# Altium footprint library 3M THD.PcbLib: 163 footprints (part 9 of 14)
Each footprint in its own frame and in the unit in brackets; x right, y up, seen from the top. Pads: shape width x height; smd on the part's side, far side on the other; paste and mask are expansions set on the pad; w line width, h text height; cw(c..) or ccw(c..) is an arc to the next point about the centre after c.
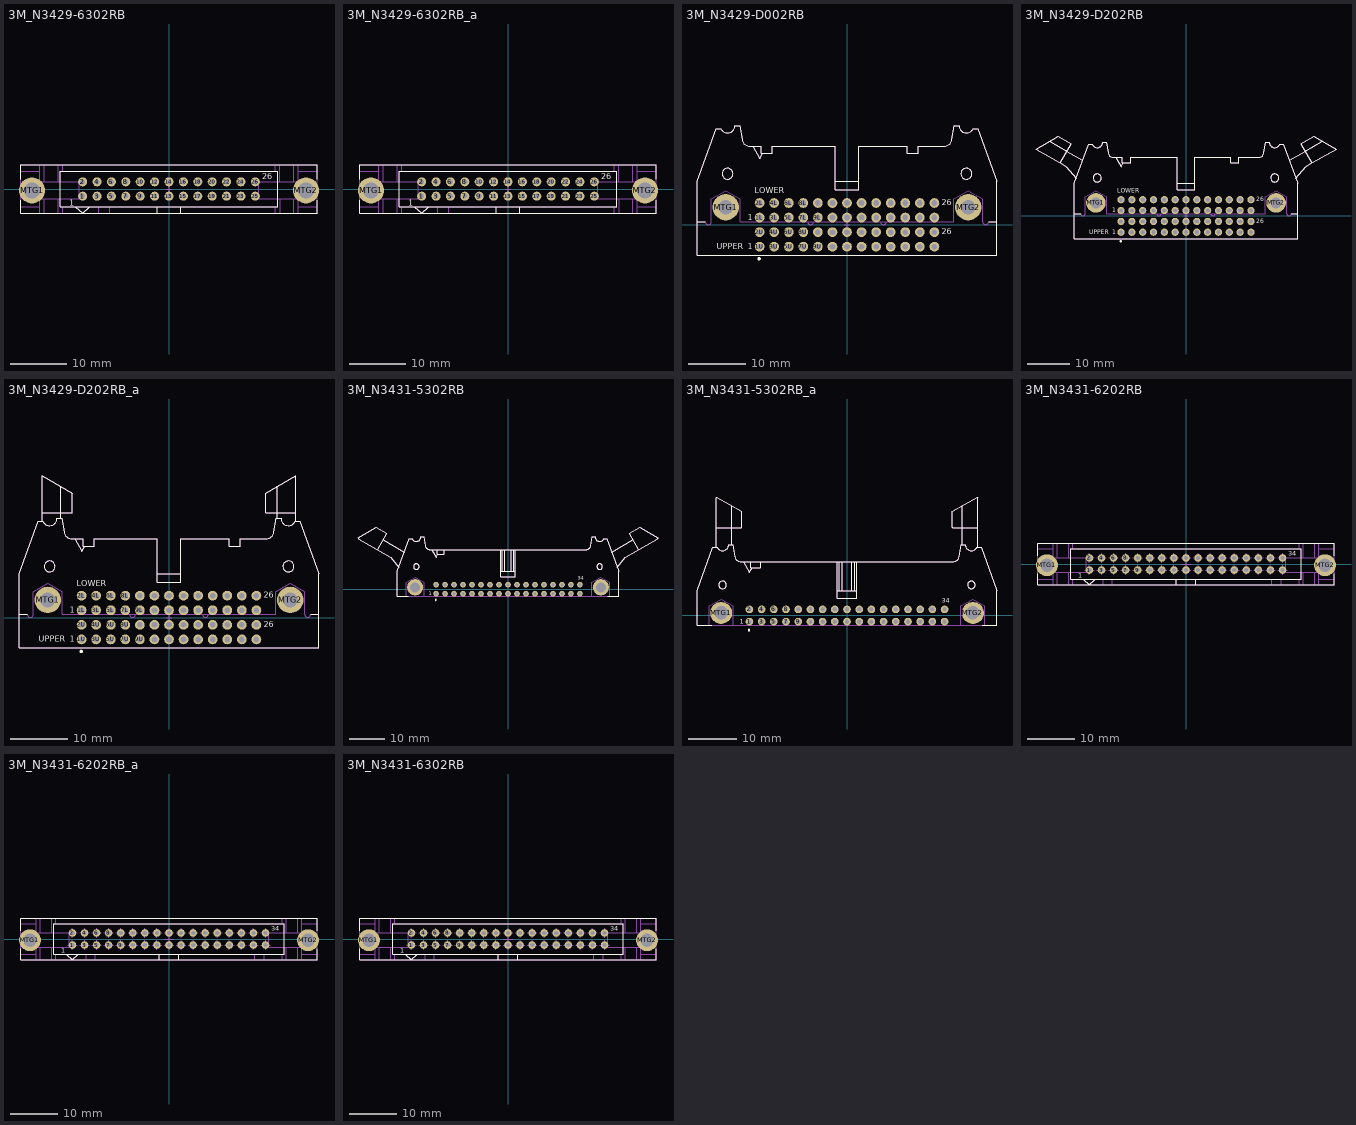
[diagram p8: the footprints below, top view; thin cyan lines are the x and y axes]

## 3M_N3429-6302RB [mm] "3M, 3000 Series, 26 Contacts - Pitch 2.54mm - Straight Four-Wall Header (Black) With Long Roll Pin Latch/Ejectors"
height 24.6
pads (28):
  round 1.6 hole 0.9: 1(-15.24,-1.27) 2(-15.24,1.27) 3(-12.7,-1.27) 4(-12.7,1.27) 5(-10.16,-1.27) 6(-10.16,1.27) 7(-7.62,-1.27) 8(-7.62,1.27) 9(-5.08,-1.27) 10(-5.08,1.27) 11(-2.54,-1.27) 12(-2.54,1.27) 13(0,-1.27) 14(0,1.27) 15(2.54,-1.27) 16(2.54,1.27) 17(5.08,-1.27) 18(5.08,1.27) 19(7.62,-1.27) 20(7.62,1.27) 21(10.16,-1.27) 22(10.16,1.27) 23(12.7,-1.27) 24(12.7,1.27) 25(15.24,-1.27) 26(15.24,1.27)
  round 4.6 hole 2.8: MTG1(-24.18,-0.25) MTG2(24.18,-0.25)
Top Overlay:
  lines w0.2: -26.162,-2 -26.162,-4.318 26.162,-4.318 26.162,-2 ; -26.162,1.7 -26.162,4.3 ; -26.162,4.318 26.162,4.318 ; -2.032,-4.318 -2.032,-3.175 ; 2.032,-4.318 2.032,-3.175 ; 26.162,1.7 26.162,4.3 ; -19.177,-3.175 19.177,-3.175 19.177,3.175 -19.177,3.175 -19.177,-3.175 ; -16.51,-3.175 -13.97,-3.175 -15.24,-4.318 -16.51,-3.175
  text "1" at -17.577,-2.921 h1.02
  text "26" at 16.475,1.727 h1.02
Mechanical 8:
  lines w0.1: -24.68,-0.25 -24.18,-0.25 ; -24.18,-0.75 -24.18,-0.25 ; -24.18,0.25 -24.18,-0.25 ; -23.68,-0.25 -24.18,-0.25 ; -15.74,-1.27 -15.24,-1.27 ; -15.74,1.27 -15.24,1.27 ; -15.24,-1.77 -15.24,-1.27 ; -15.24,-0.77 -15.24,-1.27 ; -15.24,0.77 -15.24,1.27 ; -15.24,1.77 -15.24,1.27 ; -14.74,-1.27 -15.24,-1.27 ; -14.74,1.27 -15.24,1.27 ; -13.2,-1.27 -12.7,-1.27 ; -13.2,1.27 -12.7,1.27 ; -12.7,-1.77 -12.7,-1.27 ; -12.7,-0.77 -12.7,-1.27 ; -12.7,0.77 -12.7,1.27 ; -12.7,1.77 -12.7,1.27 ; -12.2,-1.27 -12.7,-1.27 ; -12.2,1.27 -12.7,1.27 ; -10.66,-1.27 -10.16,-1.27 ; -10.66,1.27 -10.16,1.27 ; -10.16,-1.77 -10.16,-1.27 ; -10.16,-0.77 -10.16,-1.27 ; -10.16,0.77 -10.16,1.27 ; -10.16,1.77 -10.16,1.27 ; -9.66,-1.27 -10.16,-1.27 ; -9.66,1.27 -10.16,1.27 ; -8.12,-1.27 -7.62,-1.27 ; -8.12,1.27 -7.62,1.27 ; -7.62,-1.77 -7.62,-1.27 ; -7.62,-0.77 -7.62,-1.27 ; -7.62,0.77 -7.62,1.27 ; -7.62,1.77 -7.62,1.27 ; -7.12,-1.27 -7.62,-1.27 ; -7.12,1.27 -7.62,1.27 ; -5.58,-1.27 -5.08,-1.27 ; -5.58,1.27 -5.08,1.27 ; -5.08,-1.77 -5.08,-1.27 ; -5.08,-0.77 -5.08,-1.27 ; -5.08,0.77 -5.08,1.27 ; -5.08,1.77 -5.08,1.27 ; -4.58,-1.27 -5.08,-1.27 ; -4.58,1.27 -5.08,1.27 ; -3.04,-1.27 -2.54,-1.27 ; -3.04,1.27 -2.54,1.27 ; -2.54,-1.77 -2.54,-1.27 ; -2.54,-0.77 -2.54,-1.27 ; -2.54,0.77 -2.54,1.27 ; -2.54,1.77 -2.54,1.27 ; -2.04,-1.27 -2.54,-1.27 ; -2.04,1.27 -2.54,1.27 ; -0.5,-1.27 0,-1.27 ; -0.5,0 0,0 ; -0.5,1.27 0,1.27 ; 0,-1.77 0,-1.27 ; 0,-0.77 0,-1.27 ; 0,-0.5 0,0 ; 0,0.5 0,0 ; 0,0.77 0,1.27 ; 0,1.77 0,1.27 ; 0.5,-1.27 0,-1.27 ; 0.5,0 0,0 ; 0.5,1.27 0,1.27 ; 2.04,-1.27 2.54,-1.27 ; 2.04,1.27 2.54,1.27 ; 2.54,-1.77 2.54,-1.27 ; 2.54,-0.77 2.54,-1.27 ; 2.54,0.77 2.54,1.27 ; 2.54,1.77 2.54,1.27 ; 3.04,-1.27 2.54,-1.27 ; 3.04,1.27 2.54,1.27 ; 4.58,-1.27 5.08,-1.27 ; 4.58,1.27 5.08,1.27 ; 5.08,-1.77 5.08,-1.27 ; 5.08,-0.77 5.08,-1.27 ; 5.08,0.77 5.08,1.27 ; 5.08,1.77 5.08,1.27 ; 5.58,-1.27 5.08,-1.27 ; 5.58,1.27 5.08,1.27 ; 7.12,-1.27 7.62,-1.27 ; 7.12,1.27 7.62,1.27 ; 7.62,-1.77 7.62,-1.27 ; 7.62,-0.77 7.62,-1.27 ; 7.62,0.77 7.62,1.27 ; 7.62,1.77 7.62,1.27 ; 8.12,-1.27 7.62,-1.27 ; 8.12,1.27 7.62,1.27 ; 9.66,-1.27 10.16,-1.27 ; 9.66,1.27 10.16,1.27 ; 10.16,-1.77 10.16,-1.27 ; 10.16,-0.77 10.16,-1.27 ; 10.16,0.77 10.16,1.27 ; 10.16,1.77 10.16,1.27 ; 10.66,-1.27 10.16,-1.27 ; 10.66,1.27 10.16,1.27 ; 12.2,-1.27 12.7,-1.27 ; 12.2,1.27 12.7,1.27 ; 12.7,-1.77 12.7,-1.27 ; 12.7,-0.77 12.7,-1.27 ; 12.7,0.77 12.7,1.27 ; 12.7,1.77 12.7,1.27 ; 13.2,-1.27 12.7,-1.27 ; 13.2,1.27 12.7,1.27 ; 14.74,-1.27 15.24,-1.27 ; 14.74,1.27 15.24,1.27 ; 15.24,-1.77 15.24,-1.27 ; 15.24,-0.77 15.24,-1.27 ; 15.24,0.77 15.24,1.27 ; 15.24,1.77 15.24,1.27 ; 15.74,-1.27 15.24,-1.27 ; 15.74,1.27 15.24,1.27 ; 23.68,-0.25 24.18,-0.25 ; 24.18,-0.75 24.18,-0.25 ; 24.18,0.25 24.18,-0.25 ; 24.68,-0.25 24.18,-0.25
Mechanical 14:
  circle w0.1: c24.194,-0.254 r1.27
  circle w0.1: c-24.194,-0.254 r1.27
  lines w0.1: -26.162,-3.175 -22.834,-3.175 ; -22.834,-4.318 -22.834,-1.727 -15.875,-1.727 -15.875,1.27 -22.834,1.27 -22.834,4.318 ; -21.992,-4.318 -21.992,-1.727 ; -21.992,1.27 -21.992,4.318 ; -19.559,-4.318 -19.558,-1.727 ; -19.177,-1.727 -19.177,-3.175 19.177,-3.175 19.177,-1.727 ; -19.177,1.27 -19.177,3.175 19.177,3.175 19.177,1.27 ; -12.389,-4.318 -12.389,-3.175 ; -10.471,-4.318 -10.471,-3.175 ; 18.716,-4.318 18.716,-3.175 ; 18.716,3.175 18.716,4.318 ; 19.558,1.27 19.558,4.318 ; 19.599,-4.318 19.599,-1.727 ; 21.992,-4.318 21.992,-1.727 ; 21.992,1.27 21.992,4.318 ; 22.834,-4.318 22.834,-1.727 15.875,-1.727 15.875,1.27 22.834,1.27 22.834,4.318 ; 22.834,-3.175 26.162,-3.175 ; 22.834,3.175 26.162,3.175 ; -26.162,-4.318 -26.162,4.318 26.162,4.318 26.162,-4.318 -26.162,-4.318 ; -26.162,3.175 -22.834,3.175 -26.162,3.175 ; -25.718,-1.134 -24.194,-2.014 -22.67,-1.134 -22.67,0.626 -24.194,1.506 -25.718,0.626 -25.718,-1.134 ; -19.558,1.27 -19.558,4.318 -19.558,1.27 ; -18.716,-4.318 -18.716,-3.175 -18.716,-4.318 ; -18.716,3.175 -18.716,4.318 -18.716,3.175 ; -16.51,-3.175 -13.97,-3.175 -15.24,-4.318 -16.51,-3.175 ; 22.67,-1.134 24.194,-2.014 25.718,-1.134 25.718,0.626 24.194,1.506 22.67,0.626 22.67,-1.134
  text "1" at -17.577,-2.921 h1.02
  text "26" at 16.475,1.727 h1.02
3D body "3M_N3429-6302RB.stp": height 19.96, standoff -2.84, extent -37.289,-4.318 37.289,4.318

## 3M_N3429-6302RB_a [mm] "3M, 3000 Series, 26 Contacts - Pitch 2.54mm - Straight Four-Wall Header (Black) With Long Roll Pin Latch/Ejectors"
height 24.6
pads (28):
  round 1.6 hole 0.9: 1(-15.24,-1.27) 2(-15.24,1.27) 3(-12.7,-1.27) 4(-12.7,1.27) 5(-10.16,-1.27) 6(-10.16,1.27) 7(-7.62,-1.27) 8(-7.62,1.27) 9(-5.08,-1.27) 10(-5.08,1.27) 11(-2.54,-1.27) 12(-2.54,1.27) 13(0,-1.27) 14(0,1.27) 15(2.54,-1.27) 16(2.54,1.27) 17(5.08,-1.27) 18(5.08,1.27) 19(7.62,-1.27) 20(7.62,1.27) 21(10.16,-1.27) 22(10.16,1.27) 23(12.7,-1.27) 24(12.7,1.27) 25(15.24,-1.27) 26(15.24,1.27)
  round 4.6 hole 2.8: MTG1(-24.18,-0.25) MTG2(24.18,-0.25)
Top Overlay:
  lines w0.2: -26.162,-2 -26.162,-4.318 26.162,-4.318 26.162,-2 ; -26.162,1.7 -26.162,4.3 ; -26.162,4.318 26.162,4.318 ; -2.032,-4.318 -2.032,-3.175 ; 2.032,-4.318 2.032,-3.175 ; 26.162,1.7 26.162,4.3 ; -19.177,-3.175 -19.177,3.175 19.177,3.175 19.177,-3.175 -19.177,-3.175 ; -16.51,-3.175 -15.24,-4.318 -13.97,-3.175 -16.51,-3.175
  text "26" at 16.475,1.727 h1.02
  text "1" at -17.577,-2.921 h1.02
Mechanical 8:
  lines w0.1: -24.68,-0.25 -24.18,-0.25 ; -24.18,-0.75 -24.18,-0.25 ; -24.18,0.25 -24.18,-0.25 ; -23.68,-0.25 -24.18,-0.25 ; -15.74,-1.27 -15.24,-1.27 ; -15.74,1.27 -15.24,1.27 ; -15.24,-1.77 -15.24,-1.27 ; -15.24,-0.77 -15.24,-1.27 ; -15.24,0.77 -15.24,1.27 ; -15.24,1.77 -15.24,1.27 ; -14.74,-1.27 -15.24,-1.27 ; -14.74,1.27 -15.24,1.27 ; -13.2,-1.27 -12.7,-1.27 ; -13.2,1.27 -12.7,1.27 ; -12.7,-1.77 -12.7,-1.27 ; -12.7,-0.77 -12.7,-1.27 ; -12.7,0.77 -12.7,1.27 ; -12.7,1.77 -12.7,1.27 ; -12.2,-1.27 -12.7,-1.27 ; -12.2,1.27 -12.7,1.27 ; -10.66,-1.27 -10.16,-1.27 ; -10.66,1.27 -10.16,1.27 ; -10.16,-1.77 -10.16,-1.27 ; -10.16,-0.77 -10.16,-1.27 ; -10.16,0.77 -10.16,1.27 ; -10.16,1.77 -10.16,1.27 ; -9.66,-1.27 -10.16,-1.27 ; -9.66,1.27 -10.16,1.27 ; -8.12,-1.27 -7.62,-1.27 ; -8.12,1.27 -7.62,1.27 ; -7.62,-1.77 -7.62,-1.27 ; -7.62,-0.77 -7.62,-1.27 ; -7.62,0.77 -7.62,1.27 ; -7.62,1.77 -7.62,1.27 ; -7.12,-1.27 -7.62,-1.27 ; -7.12,1.27 -7.62,1.27 ; -5.58,-1.27 -5.08,-1.27 ; -5.58,1.27 -5.08,1.27 ; -5.08,-1.77 -5.08,-1.27 ; -5.08,-0.77 -5.08,-1.27 ; -5.08,0.77 -5.08,1.27 ; -5.08,1.77 -5.08,1.27 ; -4.58,-1.27 -5.08,-1.27 ; -4.58,1.27 -5.08,1.27 ; -3.04,-1.27 -2.54,-1.27 ; -3.04,1.27 -2.54,1.27 ; -2.54,-1.77 -2.54,-1.27 ; -2.54,-0.77 -2.54,-1.27 ; -2.54,0.77 -2.54,1.27 ; -2.54,1.77 -2.54,1.27 ; -2.04,-1.27 -2.54,-1.27 ; -2.04,1.27 -2.54,1.27 ; -0.5,-1.27 0,-1.27 ; -0.5,0 0,0 ; -0.5,1.27 0,1.27 ; 0,-1.77 0,-1.27 ; 0,-0.77 0,-1.27 ; 0,-0.5 0,0 ; 0,0.5 0,0 ; 0,0.77 0,1.27 ; 0,1.77 0,1.27 ; 0.5,-1.27 0,-1.27 ; 0.5,0 0,0 ; 0.5,1.27 0,1.27 ; 2.04,-1.27 2.54,-1.27 ; 2.04,1.27 2.54,1.27 ; 2.54,-1.77 2.54,-1.27 ; 2.54,-0.77 2.54,-1.27 ; 2.54,0.77 2.54,1.27 ; 2.54,1.77 2.54,1.27 ; 3.04,-1.27 2.54,-1.27 ; 3.04,1.27 2.54,1.27 ; 4.58,-1.27 5.08,-1.27 ; 4.58,1.27 5.08,1.27 ; 5.08,-1.77 5.08,-1.27 ; 5.08,-0.77 5.08,-1.27 ; 5.08,0.77 5.08,1.27 ; 5.08,1.77 5.08,1.27 ; 5.58,-1.27 5.08,-1.27 ; 5.58,1.27 5.08,1.27 ; 7.12,-1.27 7.62,-1.27 ; 7.12,1.27 7.62,1.27 ; 7.62,-1.77 7.62,-1.27 ; 7.62,-0.77 7.62,-1.27 ; 7.62,0.77 7.62,1.27 ; 7.62,1.77 7.62,1.27 ; 8.12,-1.27 7.62,-1.27 ; 8.12,1.27 7.62,1.27 ; 9.66,-1.27 10.16,-1.27 ; 9.66,1.27 10.16,1.27 ; 10.16,-1.77 10.16,-1.27 ; 10.16,-0.77 10.16,-1.27 ; 10.16,0.77 10.16,1.27 ; 10.16,1.77 10.16,1.27 ; 10.66,-1.27 10.16,-1.27 ; 10.66,1.27 10.16,1.27 ; 12.2,-1.27 12.7,-1.27 ; 12.2,1.27 12.7,1.27 ; 12.7,-1.77 12.7,-1.27 ; 12.7,-0.77 12.7,-1.27 ; 12.7,0.77 12.7,1.27 ; 12.7,1.77 12.7,1.27 ; 13.2,-1.27 12.7,-1.27 ; 13.2,1.27 12.7,1.27 ; 14.74,-1.27 15.24,-1.27 ; 14.74,1.27 15.24,1.27 ; 15.24,-1.77 15.24,-1.27 ; 15.24,-0.77 15.24,-1.27 ; 15.24,0.77 15.24,1.27 ; 15.24,1.77 15.24,1.27 ; 15.74,-1.27 15.24,-1.27 ; 15.74,1.27 15.24,1.27 ; 23.68,-0.25 24.18,-0.25 ; 24.18,-0.75 24.18,-0.25 ; 24.18,0.25 24.18,-0.25 ; 24.68,-0.25 24.18,-0.25
Mechanical 14:
  circle w0.1: c-24.194,-0.254 r1.27
  circle w0.1: c24.194,-0.254 r1.27
  lines w0.1: -26.162,-3.175 -22.834,-3.175 ; -22.834,-4.318 -22.834,-1.727 -15.875,-1.727 -15.875,1.27 -22.834,1.27 -22.834,4.318 ; -21.992,-4.318 -21.992,-1.727 ; -21.992,1.27 -21.992,4.318 ; -19.559,-4.318 -19.558,-1.727 ; -19.177,-1.727 -19.177,-3.175 19.177,-3.175 19.177,-1.727 ; -19.177,1.27 -19.177,3.175 19.177,3.175 19.177,1.27 ; -12.389,-4.318 -12.389,-3.175 ; -10.471,-4.318 -10.471,-3.175 ; 18.716,-4.318 18.716,-3.175 ; 18.716,3.175 18.716,4.318 ; 19.558,1.27 19.558,4.318 ; 19.599,-4.318 19.599,-1.727 ; 21.992,-4.318 21.992,-1.727 ; 21.992,1.27 21.992,4.318 ; 22.834,-4.318 22.834,-1.727 15.875,-1.727 15.875,1.27 22.834,1.27 22.834,4.318 ; 22.834,-3.175 26.162,-3.175 ; 22.834,3.175 26.162,3.175 ; -26.162,-4.318 26.162,-4.318 26.162,4.318 -26.162,4.318 -26.162,-4.318 ; -26.162,3.175 -22.834,3.175 -26.162,3.175 ; -25.718,-1.134 -25.718,0.626 -24.194,1.506 -22.67,0.626 -22.67,-1.134 -24.194,-2.014 -25.718,-1.134 ; -19.558,1.27 -19.558,4.318 -19.558,1.27 ; -18.716,-4.318 -18.716,-3.175 -18.716,-4.318 ; -18.716,3.175 -18.716,4.318 -18.716,3.175 ; -16.51,-3.175 -15.24,-4.318 -13.97,-3.175 -16.51,-3.175 ; 22.67,-1.134 22.67,0.626 24.194,1.506 25.718,0.626 25.718,-1.134 24.194,-2.014 22.67,-1.134
  text "26" at 16.475,1.727 h1.02
  text "1" at -17.577,-2.921 h1.02
3D body "3M_N3429-6302RB_a.stp": height 27.18, standoff -2.84, extent -26.162,-4.318 26.162,4.318

## 3M_N3429-D002RB [mm] "3M, 3000 Series, 2x26 Contacts - Pitch 2.54mm - Right Angle Four-Wall Condo Header (Black) Without Latch/Ejectors"
height 15.5
pads (54):
  round 1.7 hole 1: 1L(-15.24,1.27) 1U(-15.24,-3.81) 2L(-15.24,3.81) 2U(-15.24,-1.27) 3L(-12.7,1.27) 3U(-12.7,-3.81) 4L(-12.7,3.81) 4U(-12.7,-1.27) 5L(-10.16,1.27) 5U(-10.16,-3.81) 6L(-10.16,3.81) 6U(-10.16,-1.27) 7L(-7.62,1.27) 7U(-7.62,-3.81) 8L(-7.62,3.81) 8U(-7.62,-1.27) 9L(-5.08,1.27) 9U(-5.08,-3.81) 10L(-5.08,3.81) 10U(-5.08,-1.27) 11L(-2.54,1.27) 11U(-2.54,-3.81) 12L(-2.54,3.81) 12U(-2.54,-1.27) 13L(0,1.27) 13U(0,-3.81) 14L(0,3.81) 14U(0,-1.27) 15L(2.54,1.27) 15U(2.54,-3.81) 16L(2.54,3.81) 16U(2.54,-1.27) 17L(5.08,1.27) 17U(5.08,-3.81) 18L(5.08,3.81) 18U(5.08,-1.27) 19L(7.62,1.27) 19U(7.62,-3.81) 20L(7.62,3.81) 20U(7.62,-1.27) 21L(10.16,1.27) 21U(10.16,-3.81) 22L(10.16,3.81) 22U(10.16,-1.27) 23L(12.7,1.27) 23U(12.7,-3.81) 24L(12.7,3.81) 24U(12.7,-1.27) 25L(15.24,1.27) 25U(15.24,-3.81) 26L(15.24,3.81) 26U(15.24,-1.27)
  round 4.6 hole 2.6: MTG1(-21.146,3.073) MTG2(21.146,3.073)
Top Overlay:
  circle w0.2: c-20.828,8.915 r0.953
  circle w0.2: c20.828,8.915 r0.953
  circle w0.2: c20.828,8.915 r0.953
  circle w0.2: c-20.828,8.915 r0.953
  circle w0.2: c-20.828,8.915 r0.953
  circle w0.3: c-15.313,-5.913 r0.15
  lines w0.2: -26.162,0.533 -24.702,0.533 ; -16.478,13.741 -15.208,11.542 -14.671,12.471 ; -2.032,7.645 2.032,7.645 ; 24.702,0.533 26.162,0.533 ; -26.162,-5.309 -26.162,7.645 -22.834,16.789 -21.992,16.789 ccw(c-20.828,17.297) -19.558,17.297 -18.716,17.297 -18.286,14.859 ccw(c-16.989,15.053) -16.954,13.741 -14.929,13.741 -14.929,12.471 -13.011,12.471 -13.011,13.741 -2.032,13.741 -2.032,6.121 2.032,6.121 2.032,13.741 10.471,13.741 10.471,12.471 12.389,12.471 12.389,13.741 16.954,13.741 ccw(c16.989,15.053) 18.286,14.859 18.716,17.297 19.558,17.297 ccw(c20.828,17.297) 21.992,16.789 22.834,16.789 26.162,7.645 26.162,-5.309 -26.162,-5.309
  text "26" at 16.5,3.429 h1.02
  text "1" at -17.272,0.84 h1.02
  text "1" at -17.272,-4.24 h1.02
  text "UPPER" at -22.75,-4.25 h1
  text "LOWER" at -16.125,5.475 h1
  text "26" at 16.5,-1.651 h1.02
Mechanical 8:
  drawing of 245 lines, arcs and shapes, not listed
Mechanical 14:
  circle w0.1: c-21.146,3.073 r1.27
  circle w0.1: c21.146,3.073 r1.27
  circle w0.1: c-20.828,8.915 r0.953
  circle w0.1: c20.828,8.915 r0.953
  lines w0.1: -26.162,0.533 -24.702,0.533 ccw(c-24.194,0.533) -23.686,0.533 -23.647,0.533 -23.647,4.518 -21.146,5.962 -18.644,4.518 -18.644,0.533 18.644,0.533 18.644,4.518 21.146,5.962 23.647,4.518 23.647,0.533 23.686,0.533 ccw(c24.194,0.533) 24.702,0.533 26.162,0.533 ; -16.478,13.741 -15.208,11.542 -14.671,12.471 ; -6.858,0.533 ccw(c-6.35,0.533) -5.842,0.533 ; -2.032,7.645 2.032,7.645 ; 5.842,0.533 ccw(c6.35,0.533) 6.858,0.533 ; -26.162,-5.309 -26.162,7.645 -22.834,16.789 -21.992,16.789 ccw(c-20.828,17.297) -19.558,17.297 -18.716,17.297 -18.286,14.859 ccw(c-16.989,15.053) -16.954,13.741 -14.929,13.741 -14.929,12.471 -13.011,12.471 -13.011,13.741 -2.032,13.741 -2.032,6.121 2.032,6.121 2.032,13.741 10.471,13.741 10.471,12.471 12.389,12.471 12.389,13.741 16.954,13.741 ccw(c16.989,15.053) 18.286,14.859 18.716,17.297 19.558,17.297 ccw(c20.828,17.297) 21.992,16.789 22.834,16.789 26.162,7.645 26.162,-5.309 -26.162,-5.309
  text "26" at 16.5,3.429 h1.02
  text "1" at -17.272,0.84 h1.02
  text "1" at -17.272,-4.24 h1.02
  text "1" at -17.272,-4.24 h1.02
  text "UPPER" at -22.75,-4.25 h1
  text "LOWER" at -16.125,5.475 h1
  text "26" at 16.5,-1.651 h1.02
3D body "3M_N3429-D002RB.stp": height 15.49, standoff -2.84, extent -26.162,-5.308 26.162,17.298

## 3M_N3429-D202RB [mm] "3M, 3000 Series, 2x26 Contacts - Pitch 2.54mm - Right Angle Four-Wall Condo Header (Black) With Short Roll Pin Latch/Ejectors"
height 15.5
pads (54):
  round 1.7 hole 1: 1L(-15.24,1.27) 1U(-15.24,-3.81) 2L(-15.24,3.81) 2U(-15.24,-1.27) 3L(-12.7,1.27) 3U(-12.7,-3.81) 4L(-12.7,3.81) 4U(-12.7,-1.27) 5L(-10.16,1.27) 5U(-10.16,-3.81) 6L(-10.16,3.81) 6U(-10.16,-1.27) 7L(-7.62,1.27) 7U(-7.62,-3.81) 8L(-7.62,3.81) 8U(-7.62,-1.27) 9L(-5.08,1.27) 9U(-5.08,-3.81) 10L(-5.08,3.81) 10U(-5.08,-1.27) 11L(-2.54,1.27) 11U(-2.54,-3.81) 12L(-2.54,3.81) 12U(-2.54,-1.27) 13L(0,1.27) 13U(0,-3.81) 14L(0,3.81) 14U(0,-1.27) 15L(2.54,1.27) 15U(2.54,-3.81) 16L(2.54,3.81) 16U(2.54,-1.27) 17L(5.08,1.27) 17U(5.08,-3.81) 18L(5.08,3.81) 18U(5.08,-1.27) 19L(7.62,1.27) 19U(7.62,-3.81) 20L(7.62,3.81) 20U(7.62,-1.27) 21L(10.16,1.27) 21U(10.16,-3.81) 22L(10.16,3.81) 22U(10.16,-1.27) 23L(12.7,1.27) 23U(12.7,-3.81) 24L(12.7,3.81) 24U(12.7,-1.27) 25L(15.24,1.27) 25U(15.24,-3.81) 26L(15.24,3.81) 26U(15.24,-1.27)
  round 4.6 hole 2.6: MTG1(-21.146,3.073) MTG2(21.146,3.073)
Top Overlay:
  circle w0.2: c-20.828,8.915 r0.953
  circle w0.2: c20.828,8.915 r0.953
  circle w0.2: c20.828,8.915 r0.953
  circle w0.2: c-20.828,8.915 r0.953
  circle w0.2: c-20.828,8.915 r0.953
  circle w0.3: c-15.313,-5.913 r0.15
  lines w0.2: -31.967,17.546 -27.948,15.226 -24.192,13.057 ; -26.162,0.533 -24.702,0.533 ; -25.74,8.806 -28.051,11.56 -29.561,12.432 ; -16.478,13.741 -15.208,11.542 -14.671,12.471 ; -2.032,7.645 2.032,7.645 ; 24.192,13.057 27.948,15.226 31.967,17.546 ; 24.702,0.533 26.162,0.533 ; 25.74,8.806 28.051,11.56 29.561,12.432 ; -29.561,12.432 -26.932,16.986 -29.935,18.719 -35.193,15.684 -29.561,12.432 ; 29.561,12.432 26.932,16.986 29.935,18.719 35.193,15.684 29.561,12.432 ; -26.162,-5.309 -26.162,7.645 -22.834,16.789 -21.992,16.789 ccw(c-20.828,17.297) -19.558,17.297 -18.716,17.297 -18.286,14.859 ccw(c-16.989,15.053) -16.954,13.741 -14.929,13.741 -14.929,12.471 -13.011,12.471 -13.011,13.741 -2.032,13.741 -2.032,6.121 2.032,6.121 2.032,13.741 10.471,13.741 10.471,12.471 12.389,12.471 12.389,13.741 16.954,13.741 ccw(c16.989,15.053) 18.286,14.859 18.716,17.297 19.558,17.297 ccw(c20.828,17.297) 21.992,16.789 22.834,16.789 26.162,7.645 26.162,-5.309 -26.162,-5.309
  text "26" at 16.5,3.429 h1.02
  text "1" at -17.272,0.84 h1.02
  text "1" at -17.272,-4.24 h1.02
  text "UPPER" at -22.75,-4.25 h1
  text "LOWER" at -16.125,5.475 h1
  text "26" at 16.5,-1.651 h1.02
Mechanical 8:
  drawing of 245 lines, arcs and shapes, not listed
Mechanical 14:
  circle w0.1: c-21.146,3.073 r1.27
  circle w0.1: c21.146,3.073 r1.27
  circle w0.1: c-20.828,8.915 r0.953
  circle w0.1: c20.828,8.915 r0.953
  lines w0.1: -31.967,17.546 -27.948,15.226 -24.192,13.057 ; -26.162,0.533 -24.702,0.533 ccw(c-24.194,0.533) -23.686,0.533 -23.647,0.533 -23.647,4.518 -21.146,5.962 -18.644,4.518 -18.644,0.533 18.644,0.533 18.644,4.518 21.146,5.962 23.647,4.518 23.647,0.533 23.686,0.533 ccw(c24.194,0.533) 24.702,0.533 26.162,0.533 ; -25.74,8.806 -28.051,11.56 -29.561,12.432 ; -16.478,13.741 -15.208,11.542 -14.671,12.471 ; -6.858,0.533 ccw(c-6.35,0.533) -5.842,0.533 ; -2.032,7.645 2.032,7.645 ; 5.842,0.533 ccw(c6.35,0.533) 6.858,0.533 ; 24.192,13.057 27.948,15.226 31.967,17.546 ; 25.74,8.806 28.051,11.56 29.561,12.432 ; -29.561,12.432 -26.932,16.986 -29.935,18.719 -35.193,15.684 -29.561,12.432 ; 29.561,12.432 26.932,16.986 29.935,18.719 35.193,15.684 29.561,12.432 ; -26.162,-5.309 -26.162,7.645 -22.834,16.789 -21.992,16.789 ccw(c-20.828,17.297) -19.558,17.297 -18.716,17.297 -18.286,14.859 ccw(c-16.989,15.053) -16.954,13.741 -14.929,13.741 -14.929,12.471 -13.011,12.471 -13.011,13.741 -2.032,13.741 -2.032,6.121 2.032,6.121 2.032,13.741 10.471,13.741 10.471,12.471 12.389,12.471 12.389,13.741 16.954,13.741 ccw(c16.989,15.053) 18.286,14.859 18.716,17.297 19.558,17.297 ccw(c20.828,17.297) 21.992,16.789 22.834,16.789 26.162,7.645 26.162,-5.309 -26.162,-5.309
  text "26" at 16.5,3.429 h1.02
  text "1" at -17.272,0.84 h1.02
  text "1" at -17.272,-4.24 h1.02
  text "1" at -17.272,-4.24 h1.02
  text "UPPER" at -22.75,-4.25 h1
  text "LOWER" at -16.125,5.475 h1
  text "26" at 16.5,-1.651 h1.02
3D body "3M_N3429-D202RB.stp": height 15.49, standoff -2.84, extent -35.091,-5.308 35.091,18.719

## 3M_N3429-D202RB_a [mm] "3M, 3000 Series, 2x26 Contacts - Pitch 2.54mm - Right Angle Four-Wall Condo Header (Black) With Short Roll Pin Latch/Ejectors"
height 15.5
pads (54):
  round 1.7 hole 1: 1L(-15.24,1.27) 1U(-15.24,-3.81) 2L(-15.24,3.81) 2U(-15.24,-1.27) 3L(-12.7,1.27) 3U(-12.7,-3.81) 4L(-12.7,3.81) 4U(-12.7,-1.27) 5L(-10.16,1.27) 5U(-10.16,-3.81) 6L(-10.16,3.81) 6U(-10.16,-1.27) 7L(-7.62,1.27) 7U(-7.62,-3.81) 8L(-7.62,3.81) 8U(-7.62,-1.27) 9L(-5.08,1.27) 9U(-5.08,-3.81) 10L(-5.08,3.81) 10U(-5.08,-1.27) 11L(-2.54,1.27) 11U(-2.54,-3.81) 12L(-2.54,3.81) 12U(-2.54,-1.27) 13L(0,1.27) 13U(0,-3.81) 14L(0,3.81) 14U(0,-1.27) 15L(2.54,1.27) 15U(2.54,-3.81) 16L(2.54,3.81) 16U(2.54,-1.27) 17L(5.08,1.27) 17U(5.08,-3.81) 18L(5.08,3.81) 18U(5.08,-1.27) 19L(7.62,1.27) 19U(7.62,-3.81) 20L(7.62,3.81) 20U(7.62,-1.27) 21L(10.16,1.27) 21U(10.16,-3.81) 22L(10.16,3.81) 22U(10.16,-1.27) 23L(12.7,1.27) 23U(12.7,-3.81) 24L(12.7,3.81) 24U(12.7,-1.27) 25L(15.24,1.27) 25U(15.24,-3.81) 26L(15.24,3.81) 26U(15.24,-1.27)
  round 4.6 hole 2.6: MTG1(-21.146,3.073) MTG2(21.146,3.073)
Top Overlay:
  circle w0.3: c-15.313,-5.913 r0.15
  circle w0.2: c-20.828,8.915 r0.953
  circle w0.2: c-20.828,8.915 r0.953
  circle w0.2: c20.828,8.915 r0.953
  circle w0.2: c20.828,8.915 r0.953
  circle w0.2: c-20.828,8.915 r0.953
  lines w0.2: -26.162,0.533 -24.702,0.533 ; -22.149,16.789 -22.149,24.74 -16.891,21.704 -16.891,18.237 -22.149,18.237 ; -18.923,17.297 -18.923,22.877 ; -16.478,13.741 -15.208,11.542 -14.671,12.471 ; -2.032,7.645 2.032,7.645 ; 18.923,17.297 18.923,22.877 ; 22.149,16.789 22.149,24.74 16.891,21.704 16.891,18.237 22.149,18.237 ; 24.702,0.533 26.162,0.533 ; -26.162,-5.309 26.162,-5.309 26.162,7.645 22.834,16.789 21.992,16.789 cw(c20.828,17.297) 19.558,17.297 18.716,17.297 18.286,14.859 cw(c16.989,15.053) 16.954,13.741 12.389,13.741 12.389,12.471 10.471,12.471 10.471,13.741 2.032,13.741 2.032,6.121 -2.032,6.121 -2.032,13.741 -13.011,13.741 -13.011,12.471 -14.929,12.471 -14.929,13.741 -16.954,13.741 cw(c-16.989,15.053) -18.286,14.859 -18.716,17.297 -19.558,17.297 cw(c-20.828,17.297) -21.992,16.789 -22.834,16.789 -26.162,7.645 -26.162,-5.309
  text "26" at 16.5,-1.651 h1.02
  text "LOWER" at -16.125,5.475 h1
  text "UPPER" at -22.75,-4.25 h1
  text "1" at -17.272,-4.24 h1.02
  text "1" at -17.272,0.84 h1.02
  text "26" at 16.5,3.429 h1.02
Mechanical 8:
  drawing of 245 lines, arcs and shapes, not listed
Mechanical 14:
  circle w0.1: c20.828,8.915 r0.953
  circle w0.1: c-20.828,8.915 r0.953
  circle w0.1: c21.146,3.073 r1.27
  circle w0.1: c-21.146,3.073 r1.27
  lines w0.1: -26.162,0.533 -24.702,0.533 ccw(c-24.194,0.533) -23.686,0.533 -23.647,0.533 -23.647,4.518 -21.146,5.962 -18.644,4.518 -18.644,0.533 18.644,0.533 18.644,4.518 21.146,5.962 23.647,4.518 23.647,0.533 23.686,0.533 ccw(c24.194,0.533) 24.702,0.533 26.162,0.533 ; -22.149,16.789 -22.149,24.74 -16.891,21.704 -16.891,18.237 -22.149,18.237 ; -18.923,17.297 -18.923,22.877 ; -16.478,13.741 -15.208,11.542 -14.671,12.471 ; -6.858,0.533 ccw(c-6.35,0.533) -5.842,0.533 ; -2.032,7.645 2.032,7.645 ; 5.842,0.533 ccw(c6.35,0.533) 6.858,0.533 ; 18.923,17.297 18.923,22.877 ; 22.149,16.789 22.149,24.74 16.891,21.704 16.891,18.237 22.149,18.237 ; -26.162,-5.309 26.162,-5.309 26.162,7.645 22.834,16.789 21.992,16.789 cw(c20.828,17.297) 19.558,17.297 18.716,17.297 18.286,14.859 cw(c16.989,15.053) 16.954,13.741 12.389,13.741 12.389,12.471 10.471,12.471 10.471,13.741 2.032,13.741 2.032,6.121 -2.032,6.121 -2.032,13.741 -13.011,13.741 -13.011,12.471 -14.929,12.471 -14.929,13.741 -16.954,13.741 cw(c-16.989,15.053) -18.286,14.859 -18.716,17.297 -19.558,17.297 cw(c-20.828,17.297) -21.992,16.789 -22.834,16.789 -26.162,7.645 -26.162,-5.309
  text "26" at 16.5,-1.651 h1.02
  text "LOWER" at -16.125,5.475 h1
  text "UPPER" at -22.75,-4.25 h1
  text "1" at -17.272,-4.24 h1.02
  text "1" at -17.272,-4.24 h1.02
  text "1" at -17.272,0.84 h1.02
  text "26" at 16.5,3.429 h1.02
3D body "3M_N3429-D202RB_a.stp": height 15.49, standoff -2.84, extent -26.162,-5.308 26.162,24.665
